# Altium footprint library 6-Connectors-4.PcbLib: 166 footprints (part 5 of 12)
Each footprint in its own frame and in the unit in brackets; x right, y up, seen from the top. Pads: shape width x height; smd on the part's side, far side on the other; paste and mask are expansions set on the pad; w line width, h text height; cw(c..) or ccw(c..) is an arc to the next point about the centre after c.
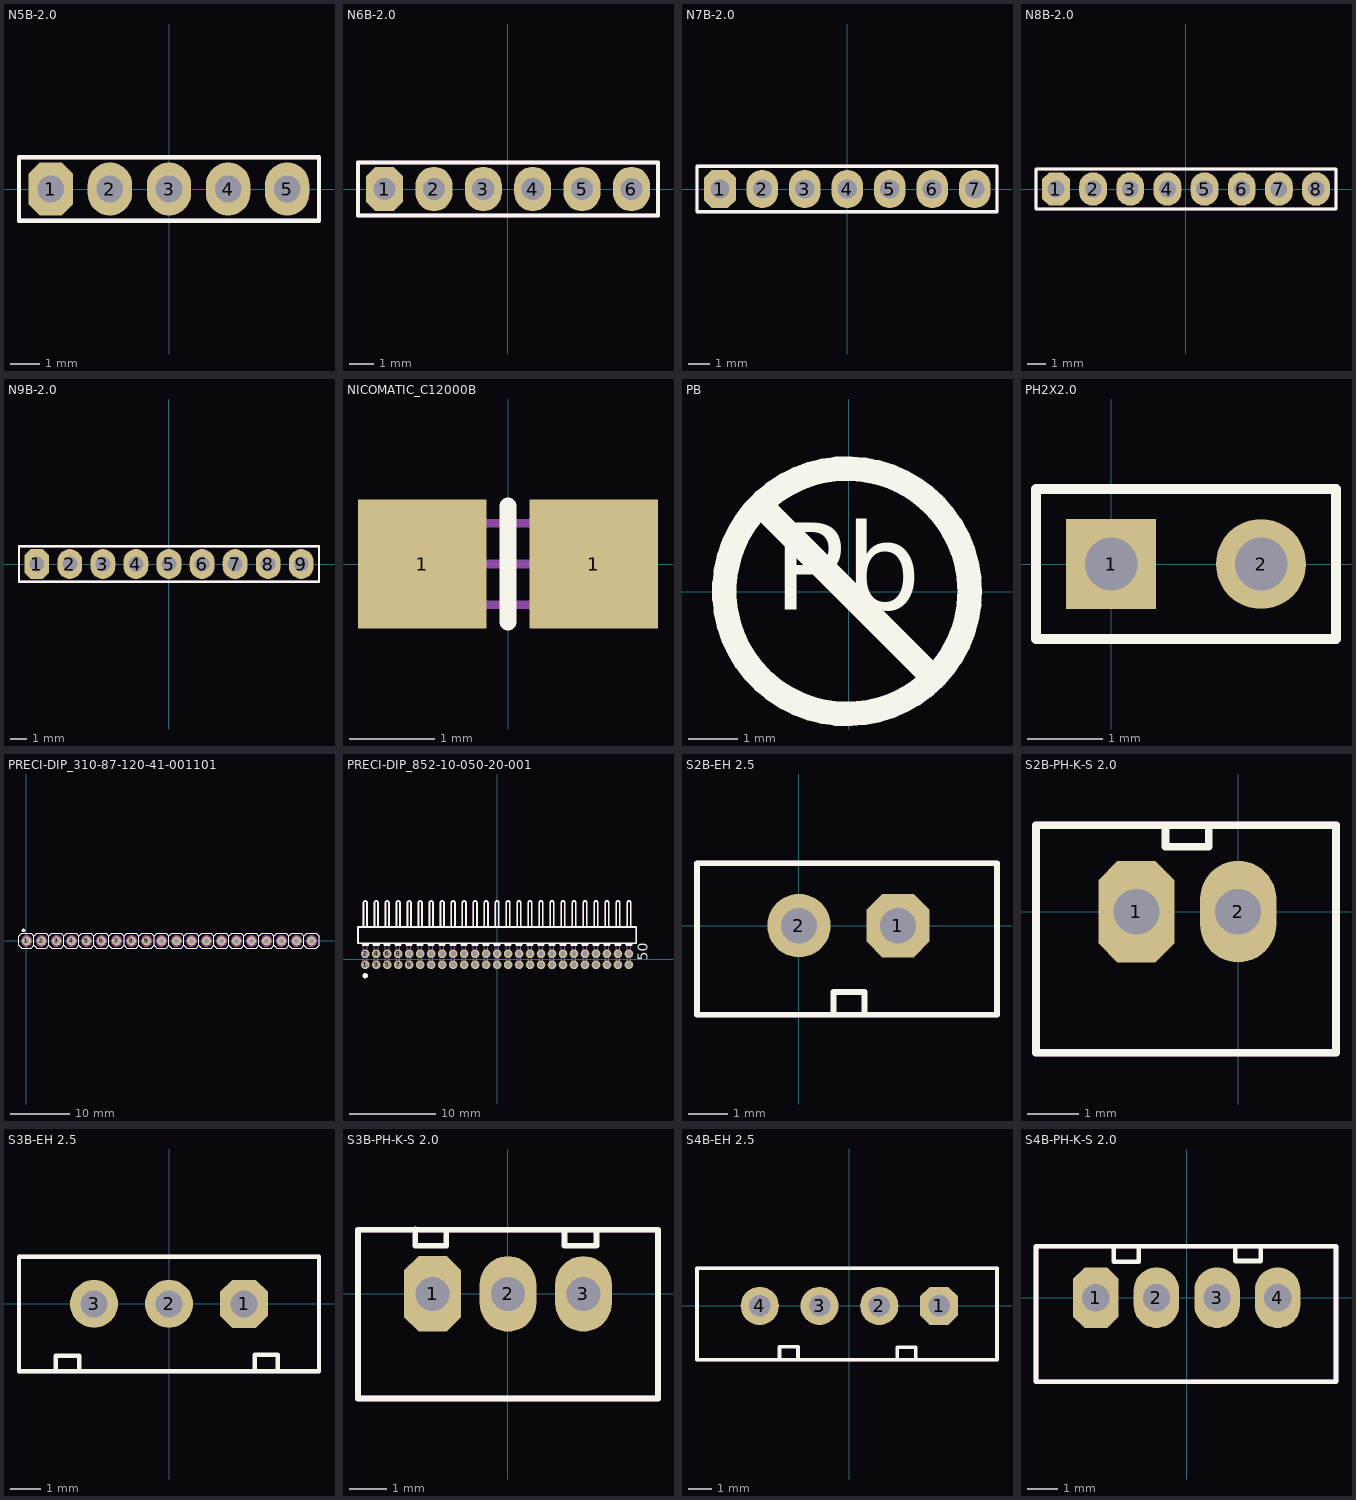
[diagram p4: the footprints below, top view; thin cyan lines are the x and y axes]

## N5B-2.0 [mm]
height 8.4
pads (5):
  oct 1.5x1.8 hole 0.9: 1(-4,0)
  oval 1.5x1.8 hole 0.9: 2(-2,0) 3(0,0) 4(2,0) 5(4,0)
Top Overlay:
  lines w0.15: -5.075,-1.075 -5.075,1.075 5.075,1.075 5.075,-1.075 -5.075,-1.075
Mechanical 10:
  lines w0.15: -5.075,-1.075 -5.075,1.075 5.075,1.075 5.075,-1.075 -5.075,-1.075
Mechanical 15:
  lines w0.15: -5.075,-1.075 -5.075,1.075 5.075,1.075 5.075,-1.075 -5.075,-1.075
3D body "1x2x05.stp": height 5.6, standoff -2.8, extent -5,-1 5,1

## N6B-2.0 [mm]
height 8.4
pads (6):
  oct 1.5x1.8 hole 0.9: 1(-5,0)
  oval 1.5x1.8 hole 0.9: 2(-3,0) 3(-1,0) 4(1,0) 5(3,0) 6(5,0)
Top Overlay:
  lines w0.15: -6.075,-1.075 -6.075,1.075 6.075,1.075 6.075,-1.075 -6.075,-1.075
Mechanical 10:
  lines w0.15: -6.075,-1.075 -6.075,1.075 6.075,1.075 6.075,-1.075 -6.075,-1.075
Mechanical 15:
  lines w0.15: -6.075,-1.075 -6.075,1.075 6.075,1.075 6.075,-1.075 -6.075,-1.075
3D body "1x2x06.stp": height 5.6, standoff -2.8, extent -6,-1 6,1

## N7B-2.0 [mm]
height 8.4
pads (7):
  oct 1.5x1.8 hole 0.9: 1(-6,0)
  oval 1.5x1.8 hole 0.9: 2(-4,0) 3(-2,0) 4(0,0) 5(2,0) 6(4,0) 7(6,0)
Top Overlay:
  lines w0.15: -7.075,-1.075 -7.075,1.075 7.05,1.075 7.05,-1.075 -7.075,-1.075
Mechanical 10:
  lines w0.15: -7.075,-1.075 -7.075,1.075 7.05,1.075 7.05,-1.075 -7.075,-1.075
Mechanical 15:
  lines w0.15: -7.075,-1.075 -7.075,1.075 7.05,1.075 7.05,-1.075 -7.075,-1.075
3D body "1x2x07.stp": height 5.6, standoff -2.8, extent -7.025,-1 6.975,1

## N8B-2.0 [mm]
height 8.4
pads (8):
  oct 1.5x1.8 hole 0.9: 1(-7,0)
  oval 1.5x1.8 hole 0.9: 2(-5,0) 3(-3,0) 4(-1,0) 5(1,0) 6(3,0) 7(5,0) 8(7,0)
Top Overlay:
  lines w0.15: -8.075,-1.075 -8.075,1.075 8.075,1.075 8.075,-1.075 -8.075,-1.075
Mechanical 10:
  lines w0.15: -8.075,-1.075 -8.075,1.075 8.075,1.075 8.075,-1.075 -8.075,-1.075
Mechanical 15:
  lines w0.15: -8.075,-1.075 -8.075,1.075 8.075,1.075 8.075,-1.075 -8.075,-1.075
3D body "1x2x08.stp": height 5.6, standoff -2.8, extent -8,-1 8,1

## N9B-2.0 [mm]
height 8.4
pads (9):
  oct 1.5x1.8 hole 0.9: 1(-8,0)
  oval 1.5x1.8 hole 0.9: 2(-6,0) 3(-4,0) 4(-2,0) 5(0,0) 6(2,0) 7(4,0) 8(6,0) 9(8,0)
Top Overlay:
  lines w0.15: -9.075,-1.075 -9.075,1.075 9.075,1.075 9.075,-1.075 -9.075,-1.075
Mechanical 10:
  lines w0.15: -9.075,-1.075 -9.075,1.075 9.075,1.075 9.075,-1.075 -9.075,-1.075
Mechanical 15:
  lines w0.15: -9.075,-1.075 -9.075,1.075 9.075,1.075 9.075,-1.075 -9.075,-1.075
3D body "1x2x09.stp": height 5.6, standoff -2.8, extent -9.025,-1 8.975,1

## NICOMATIC_C12000B [mm] "Surface Mount PCB Test Point"
height 1.5
pads (2):
  rect 1.5x1.5 smd: 1(-1,0) 1(1,0)
Top Overlay:
  lines w0.2: 0,-0.675 0,0.675
Mechanical 8:
  lines w0.1: -0.6,0 0,0 ; 0,-0.6 0,0 ; 0,0.6 0,0 ; 0.6,0 0,0
Mechanical 14:
  lines w0.1: -1.25,-0.675 -1.25,0.675 -0.35,0.675 -0.35,0.475 0.35,0.475 0.35,0.675 1.25,0.675 1.25,-0.675 0.35,-0.675 0.35,-0.475 -0.35,-0.475 -0.35,-0.675 -1.25,-0.675
3D body "p150-150.stp": height 0.02, standoff 0, extent 0.266,-0.75 1.766,0.75
3D body "p150-150.stp": height 0.02, standoff 0, extent -1.766,-0.75 -0.266,0.75
3D body "NICOMATIC_C12000B.stp": height 1.5, standoff 0, extent -1.25,-0.675 1.25,0.675

## PB [mm]
Top Overlay:
  circle w0.5: c-0.031,0.013 r2.5
  lines w0.5: -1.737,1.719 1.675,-1.693
  text "Pb" at -1.536,-0.948 h3.05
3D body "pb.stp": height 0.02, standoff 0, extent -2.725,-2.725 2.725,2.725

## PH2X2.0 [mm]
height 8.4
pads (2):
  rect 1.2x1.2 hole 0.7: 1(0,0)
  round 1.2 hole 0.7: 2(2,0)
Top Overlay:
  lines w0.127: -1,-1 -1,1 3,1 3,-1 -1,-1

## PRECI-DIP_310-87-120-41-001101 [mm] "20 Contact 2.54mm Pitch Single Row Socket Connector - Mating Pin  ?.47mm"
height 4.2
pads (20):
  round 1.5 hole 0.8: 1(0,0) 2(2.54,0) 3(5.08,0) 4(7.62,0) 5(10.16,0) 6(12.7,0) 7(15.24,0) 8(17.78,0) 9(20.32,0) 10(22.86,0) 11(25.4,0) 12(27.94,0) 13(30.48,0) 14(33.02,0) 15(35.56,0) 16(38.1,0) 17(40.64,0) 18(43.18,0) 19(45.72,0) 20(48.26,0)
Top Overlay:
  circle w0.3: c-0.508,1.778 r0.15
  lines w0.2: 1.27,-0.77 1.27,0.77 ; 1.27,-0.77 0.77,-1.27 -0.77,-1.27 -1.27,-0.77 -1.27,0.77 -0.77,1.27 0.77,1.27 1.27,0.77 ; 1.27,-0.77 1.77,-1.27 3.31,-1.27 3.81,-0.77 ; 1.27,0.77 1.77,1.27 3.31,1.27 3.81,0.77 ; 3.81,-0.77 3.81,0.77 ; 3.81,-0.77 4.31,-1.27 5.85,-1.27 6.35,-0.77 ; 3.81,0.77 4.31,1.27 5.85,1.27 6.35,0.77 ; 6.35,-0.77 6.35,0.77 ; 6.35,-0.77 6.85,-1.27 8.39,-1.27 8.89,-0.77 ; 6.35,0.77 6.85,1.27 8.39,1.27 8.89,0.77 ; 8.89,-0.77 8.89,0.77 ; 8.89,-0.77 9.39,-1.27 10.93,-1.27 11.43,-0.77 ; 8.89,0.77 9.39,1.27 10.93,1.27 11.43,0.77 ; 11.43,-0.77 11.43,0.77 ; 11.43,-0.77 11.93,-1.27 13.47,-1.27 13.97,-0.77 ; 11.43,0.77 11.93,1.27 13.47,1.27 13.97,0.77 ; 13.97,-0.77 13.97,0.77 ; 13.97,-0.77 14.47,-1.27 16.01,-1.27 16.51,-0.77 ; 13.97,0.77 14.47,1.27 16.01,1.27 16.51,0.77 ; 16.51,-0.77 16.51,0.77 ; 16.51,-0.77 17.01,-1.27 18.55,-1.27 19.05,-0.77 ; 16.51,0.77 17.01,1.27 18.55,1.27 19.05,0.77 ; 19.05,-0.77 19.05,0.77 ; 19.05,-0.77 19.55,-1.27 21.09,-1.27 21.59,-0.77 ; 19.05,0.77 19.55,1.27 21.09,1.27 21.59,0.77 ; 21.59,-0.77 21.59,0.77 ; 21.59,-0.77 22.09,-1.27 23.63,-1.27 24.13,-0.77 ; 21.59,0.77 22.09,1.27 23.63,1.27 24.13,0.77 ; 24.13,-0.77 24.13,0.77 ; 24.13,-0.77 24.63,-1.27 26.17,-1.27 26.67,-0.77 ; 24.13,0.77 24.63,1.27 26.17,1.27 26.67,0.77 ; 26.67,-0.77 26.67,0.77 ; 26.67,-0.77 27.17,-1.27 28.71,-1.27 29.21,-0.77 ; 26.67,0.77 27.17,1.27 28.71,1.27 29.21,0.77 ; 29.21,-0.77 29.21,0.77 ; 29.21,-0.77 29.71,-1.27 31.25,-1.27 31.75,-0.77 ; 29.21,0.77 29.71,1.27 31.25,1.27 31.75,0.77 ; 31.75,-0.77 31.75,0.77 ; 31.75,-0.77 32.25,-1.27 33.79,-1.27 34.29,-0.77 ; 31.75,0.77 32.25,1.27 33.79,1.27 34.29,0.77 ; 34.29,-0.77 34.29,0.77 ; 34.29,-0.77 34.79,-1.27 36.33,-1.27 36.83,-0.77 ; 34.29,0.77 34.79,1.27 36.33,1.27 36.83,0.77 ; 36.83,-0.77 36.83,0.77 ; 36.83,-0.77 37.33,-1.27 38.87,-1.27 39.37,-0.77 ; 36.83,0.77 37.33,1.27 38.87,1.27 39.37,0.77 ; 39.37,-0.77 39.37,0.77 ; 39.37,-0.77 39.87,-1.27 41.41,-1.27 41.91,-0.77 ; 39.37,0.77 39.87,1.27 41.41,1.27 41.91,0.77 ; 41.91,-0.77 41.91,0.77 ; 41.91,-0.77 42.41,-1.27 43.95,-1.27 44.45,-0.77 ; 41.91,0.77 42.41,1.27 43.95,1.27 44.45,0.77 ; 44.45,-0.77 44.45,0.77 ; 44.45,-0.77 44.95,-1.27 46.49,-1.27 46.99,-0.77 ; 44.45,0.77 44.95,1.27 46.49,1.27 46.99,0.77 ; 46.99,-0.77 46.99,0.77 ; 46.99,-0.77 47.49,-1.27 49.03,-1.27 49.53,-0.77 49.53,0.77 49.03,1.27 47.49,1.27 46.99,0.77
Mechanical 8:
  lines w0.1: -0.5,0 0,0 ; 0,-0.5 0,0 ; 0,0.5 0,0 ; 0.5,0 0,0 ; 2.04,0 2.54,0 ; 2.54,-0.5 2.54,0 ; 2.54,0.5 2.54,0 ; 3.04,0 2.54,0 ; 4.58,0 5.08,0 ; 5.08,-0.5 5.08,0 ; 5.08,0.5 5.08,0 ; 5.58,0 5.08,0 ; 7.12,0 7.62,0 ; 7.62,-0.5 7.62,0 ; 7.62,0.5 7.62,0 ; 8.12,0 7.62,0 ; 9.66,0 10.16,0 ; 10.16,-0.5 10.16,0 ; 10.16,0.5 10.16,0 ; 10.66,0 10.16,0 ; 12.2,0 12.7,0 ; 12.7,-0.5 12.7,0 ; 12.7,0.5 12.7,0 ; 13.2,0 12.7,0 ; 14.74,0 15.24,0 ; 15.24,-0.5 15.24,0 ; 15.24,0.5 15.24,0 ; 15.74,0 15.24,0 ; 17.28,0 17.78,0 ; 17.78,-0.5 17.78,0 ; 17.78,0.5 17.78,0 ; 18.28,0 17.78,0 ; 19.82,0 20.32,0 ; 20.32,-0.5 20.32,0 ; 20.32,0.5 20.32,0 ; 20.82,0 20.32,0 ; 22.36,0 22.86,0 ; 22.86,-0.5 22.86,0 ; 22.86,0.5 22.86,0 ; 23.36,0 22.86,0 ; 24.9,0 25.4,0 ; 25.4,-0.5 25.4,0 ; 25.4,0.5 25.4,0 ; 25.9,0 25.4,0 ; 27.44,0 27.94,0 ; 27.94,-0.5 27.94,0 ; 27.94,0.5 27.94,0 ; 28.44,0 27.94,0 ; 29.98,0 30.48,0 ; 30.48,-0.5 30.48,0 ; 30.48,0.5 30.48,0 ; 30.98,0 30.48,0 ; 32.52,0 33.02,0 ; 33.02,-0.5 33.02,0 ; 33.02,0.5 33.02,0 ; 33.52,0 33.02,0 ; 35.06,0 35.56,0 ; 35.56,-0.5 35.56,0 ; 35.56,0.5 35.56,0 ; 36.06,0 35.56,0 ; 37.6,0 38.1,0 ; 38.1,-0.5 38.1,0 ; 38.1,0.5 38.1,0 ; 38.6,0 38.1,0 ; 40.14,0 40.64,0 ; 40.64,-0.5 40.64,0 ; 40.64,0.5 40.64,0 ; 41.14,0 40.64,0 ; 42.68,0 43.18,0 ; 43.18,-0.5 43.18,0 ; 43.18,0.5 43.18,0 ; 43.68,0 43.18,0 ; 45.22,0 45.72,0 ; 45.72,-0.5 45.72,0 ; 45.72,0.5 45.72,0 ; 46.22,0 45.72,0 ; 47.76,0 48.26,0 ; 48.26,-0.5 48.26,0 ; 48.26,0.5 48.26,0 ; 48.76,0 48.26,0
Mechanical 14:
  drawing of 222 lines, arcs and shapes, not listed
3D body "PRECI-DIP_310-87-120-41-001101.stp": height 4.2, standoff -3.17, extent -1.27,-1.27 49.53,1.27

## PRECI-DIP_852-10-050-20-001 [mm] "50 Contacts, Ultraminiature PCB Pin Connector 1.27mm, Double Row, Solder Tail, Right Angle"
height 3.25
pads (50):
  round 1 hole 0.6: 1(-15.24,-0.635) 2(-15.24,0.635) 3(-13.97,-0.635) 4(-13.97,0.635) 5(-12.7,-0.635) 6(-12.7,0.635) 7(-11.43,-0.635) 8(-11.43,0.635) 9(-10.16,-0.635) 10(-10.16,0.635) 11(-8.89,-0.635) 12(-8.89,0.635) 13(-7.62,-0.635) 14(-7.62,0.635) 15(-6.35,-0.635) 16(-6.35,0.635) 17(-5.08,-0.635) 18(-5.08,0.635) 19(-3.81,-0.635) 20(-3.81,0.635) 21(-2.54,-0.635) 22(-2.54,0.635) 23(-1.27,-0.635) 24(-1.27,0.635) 25(0,-0.635) 26(0,0.635) 27(1.27,-0.635) 28(1.27,0.635) 29(2.54,-0.635) 30(2.54,0.635) 31(3.81,-0.635) 32(3.81,0.635) 33(5.08,-0.635) 34(5.08,0.635) 35(6.35,-0.635) 36(6.35,0.635) 37(7.62,-0.635) 38(7.62,0.635) 39(8.89,-0.635) 40(8.89,0.635) 41(10.16,-0.635) 42(10.16,0.635) 43(11.43,-0.635) 44(11.43,0.635) 45(12.7,-0.635) 46(12.7,0.635) 47(13.97,-0.635) 48(13.97,0.635) 49(15.24,-0.635) 50(15.24,0.635)
Top Overlay:
  drawing of 155 lines, arcs and shapes, not listed
  text "50" at 17.4,-0.2 h1.2
Mechanical 8:
  lines w0.1: 0,1 0,0 1,0
Mechanical 14:
  drawing of 229 lines, arcs and shapes, not listed
3D body "PRECI-DIP_852-10-050-20-001.stp": height 3.25, standoff -3.2, extent -16.08,-0.84 16.08,6.725
3D body "v105-065.stp": height 0.02, standoff -1.65, extent -15.765,-1.16 -14.715,-0.11
3D body "v105-065.stp": height 0.02, standoff -1.65, extent -15.765,0.11 -14.715,1.16
3D body "v105-065.stp": height 0.02, standoff -1.65, extent -14.495,-1.16 -13.445,-0.11
3D body "v105-065.stp": height 0.02, standoff -1.65, extent -14.495,0.11 -13.445,1.16
3D body "v105-065.stp": height 0.02, standoff -1.65, extent -13.225,0.11 -12.175,1.16
3D body "v105-065.stp": height 0.02, standoff -1.65, extent -13.225,-1.16 -12.175,-0.11
3D body "v105-065.stp": height 0.02, standoff -1.65, extent -11.955,-1.16 -10.905,-0.11
3D body "v105-065.stp": height 0.02, standoff -1.65, extent -11.955,0.11 -10.905,1.16
3D body "v105-065.stp": height 0.02, standoff -1.65, extent -6.875,0.11 -5.825,1.16
3D body "v105-065.stp": height 0.02, standoff -1.65, extent -8.145,0.11 -7.095,1.16
3D body "v105-065.stp": height 0.02, standoff -1.65, extent -9.415,0.11 -8.365,1.16
3D body "v105-065.stp": height 0.02, standoff -1.65, extent -10.685,0.11 -9.635,1.16
3D body "v105-065.stp": height 0.02, standoff -1.65, extent -6.875,-1.16 -5.825,-0.11
3D body "v105-065.stp": height 0.02, standoff -1.65, extent -8.145,-1.16 -7.095,-0.11
3D body "v105-065.stp": height 0.02, standoff -1.65, extent -9.415,-1.16 -8.365,-0.11
3D body "v105-065.stp": height 0.02, standoff -1.65, extent -10.685,-1.16 -9.635,-0.11
3D body "v105-065.stp": height 0.02, standoff -1.65, extent -1.795,0.11 -0.745,1.16
3D body "v105-065.stp": height 0.02, standoff -1.65, extent -3.065,0.11 -2.015,1.16
3D body "v105-065.stp": height 0.02, standoff -1.65, extent -4.335,0.11 -3.285,1.16
3D body "v105-065.stp": height 0.02, standoff -1.65, extent -5.605,0.11 -4.555,1.16
3D body "v105-065.stp": height 0.02, standoff -1.65, extent -1.795,-1.16 -0.745,-0.11
3D body "v105-065.stp": height 0.02, standoff -1.65, extent -3.065,-1.16 -2.015,-0.11
3D body "v105-065.stp": height 0.02, standoff -1.65, extent -4.335,-1.16 -3.285,-0.11
3D body "v105-065.stp": height 0.02, standoff -1.65, extent -5.605,-1.16 -4.555,-0.11
3D body "v105-065.stp": height 0.02, standoff -1.65, extent 3.285,0.11 4.335,1.16
3D body "v105-065.stp": height 0.02, standoff -1.65, extent 2.015,0.11 3.065,1.16
3D body "v105-065.stp": height 0.02, standoff -1.65, extent 0.745,0.11 1.795,1.16
3D body "v105-065.stp": height 0.02, standoff -1.65, extent -0.525,0.11 0.525,1.16
3D body "v105-065.stp": height 0.02, standoff -1.65, extent 3.285,-1.16 4.335,-0.11
3D body "v105-065.stp": height 0.02, standoff -1.65, extent 2.015,-1.16 3.065,-0.11
3D body "v105-065.stp": height 0.02, standoff -1.65, extent 0.745,-1.16 1.795,-0.11
3D body "v105-065.stp": height 0.02, standoff -1.65, extent -0.525,-1.16 0.525,-0.11
3D body "v105-065.stp": height 0.02, standoff -1.65, extent 8.365,0.11 9.415,1.16
3D body "v105-065.stp": height 0.02, standoff -1.65, extent 7.095,0.11 8.145,1.16
3D body "v105-065.stp": height 0.02, standoff -1.65, extent 5.825,0.11 6.875,1.16
3D body "v105-065.stp": height 0.02, standoff -1.65, extent 4.555,0.11 5.605,1.16
3D body "v105-065.stp": height 0.02, standoff -1.65, extent 8.365,-1.16 9.415,-0.11
3D body "v105-065.stp": height 0.02, standoff -1.65, extent 7.095,-1.16 8.145,-0.11
3D body "v105-065.stp": height 0.02, standoff -1.65, extent 5.825,-1.16 6.875,-0.11
3D body "v105-065.stp": height 0.02, standoff -1.65, extent 4.555,-1.16 5.605,-0.11
3D body "v105-065.stp": height 0.02, standoff -1.65, extent 13.445,0.11 14.495,1.16
3D body "v105-065.stp": height 0.02, standoff -1.65, extent 12.175,0.11 13.225,1.16
3D body "v105-065.stp": height 0.02, standoff -1.65, extent 10.905,0.11 11.955,1.16
3D body "v105-065.stp": height 0.02, standoff -1.65, extent 9.635,0.11 10.685,1.16
3D body "v105-065.stp": height 0.02, standoff -1.65, extent 13.445,-1.16 14.495,-0.11
3D body "v105-065.stp": height 0.02, standoff -1.65, extent 12.175,-1.16 13.225,-0.11
3D body "v105-065.stp": height 0.02, standoff -1.65, extent 10.905,-1.16 11.955,-0.11
3D body "v105-065.stp": height 0.02, standoff -1.65, extent 9.635,-1.16 10.685,-0.11
3D body "v105-065.stp": height 0.02, standoff -1.65, extent 14.715,-1.16 15.765,-0.11
3D body "v105-065.stp": height 0.02, standoff -1.65, extent 14.715,0.11 15.765,1.16

## S2B-EH 2.5 [mm]
height 3.25
pads (2):
  oct 1.6x1.6 hole 0.9: 1(2.5,0)
  round 1.6 hole 0.9 mask+0.07: 2(0,0)
Top Overlay:
  lines w0.15: 0.875,-2.175 0.875,-1.675 1.65,-1.675 1.65,-2.2 ; -2.575,-2.25 -2.575,1.575 5,1.575 5,-2.25 -2.575,-2.25
Mechanical 14:
  lines w0.15: -2.575,-2.25 -2.575,1.575 5,1.575 5,-2.25 -2.575,-2.25
Mechanical 15:
  lines w0.15: -2.575,-2.25 -2.575,1.575 5,1.575 5,-2.25 -2.575,-2.25
3D body "s2b-eh.stp": height 6, standoff -3.2, extent -2.575,-2.175 4.925,1.625

## S2B-PH-K-S 2.0 [mm]
height 3.25
pads (2):
  oct 1.5x2 hole 0.9: 1(-2,0)
  oval 1.5x2 hole 0.9: 2(0,0)
Top Overlay:
  lines w0.152: -1.43,1.675 -1.43,1.275 -0.58,1.275 -0.58,1.665 ; -3.975,-2.775 -3.975,1.7 1.925,1.7 1.925,-2.775 -3.975,-2.775
Mechanical 11:
  lines w0.152: -3.975,-2.775 -3.975,1.7 1.925,1.7 1.925,-2.775 -3.975,-2.775
Mechanical 14:
  lines w0.152: -3.975,-2.775 -3.975,1.7 1.925,1.7 1.925,-2.775 -3.975,-2.775
3D body "s2b-ph-k-s.stp": height 6, standoff -3.3, extent -3.975,-2.8 1.925,1.7

## S3B-EH 2.5 [mm]
height 3.25
pads (3):
  oct 1.6x1.6 hole 0.9: 1(2.5,0)
  round 1.6 hole 0.9 mask+0.07: 2(0,0) 3(-2.5,0)
Top Overlay:
  lines w0.15: -3.775,-2.225 -3.775,-1.725 -3,-1.725 -3,-2.25 ; 2.85,-2.2 2.85,-1.7 3.625,-1.7 3.625,-2.225 ; -5,-2.25 -5,1.575 5,1.575 5,-2.25 -5,-2.25
Mechanical 14:
  lines w0.15: -5,-2.25 -5,1.575 5,1.575 5,-2.25 -5,-2.25
Mechanical 15:
  lines w0.15: -5,-2.25 -5,1.575 5,1.575 5,-2.25 -5,-2.25
3D body "s3b-eh.stp": height 6, standoff -3.2, extent -5,-2.225 5,1.575

## S3B-PH-K-S 2.0 [mm]
height 3.25
pads (3):
  oct 1.5x2 hole 0.9: 1(-2,0)
  oval 1.5x2 hole 0.9: 2(0,0) 3(2,0)
Top Overlay:
  lines w0.152: -2.455,1.705 -2.455,1.275 -1.635,1.275 -1.635,1.695 ; 1.495,1.675 1.495,1.275 2.345,1.275 2.345,1.665 ; -3.975,-2.775 3.975,-2.775 3.975,1.7 -3.975,1.7 -3.975,-2.775
Mechanical 11:
  lines w0.152: -3.975,-2.775 3.975,-2.775 3.975,1.7 -3.975,1.7 -3.975,-2.775
Mechanical 14:
  lines w0.152: -3.975,-2.775 3.975,-2.775 3.975,1.7 -3.975,1.7 -3.975,-2.775
3D body "s3b-ph-k-s.stp": height 6, standoff -3.4, extent -3.95,-2.8 3.95,1.7

## S4B-EH 2.5 [mm]
height 3.25
pads (4):
  oct 1.6x1.6 hole 0.9: 1(3.75,0)
  round 1.6 hole 0.9 mask+0.07: 2(1.25,0) 3(-1.25,0) 4(-3.75,0)
Top Overlay:
  lines w0.15: -2.925,-2.2 -2.925,-1.7 -2.15,-1.7 -2.15,-2.225 ; 2,-2.225 2,-1.725 2.775,-1.725 2.775,-2.25 ; -6.375,-2.25 6.175,-2.25 6.175,1.575 -6.375,1.575 -6.375,-2.25
Mechanical 14:
  lines w0.15: -6.375,-2.25 6.175,-2.25 6.175,1.575 -6.375,1.575 -6.375,-2.25
Mechanical 15:
  lines w0.15: -6.375,-2.25 6.175,-2.25 6.175,1.575 -6.375,1.575 -6.375,-2.25
3D body "s4b-eh.stp": height 6, standoff -3.2, extent -6.375,-2.225 6.125,1.575

## S4B-PH-K-S 2.0 [mm]
height 3.25
pads (4):
  oct 1.5x2 hole 0.9: 1(-3,0)
  oval 1.5x2 hole 0.9: 2(-1,0) 3(1,0) 4(3,0)
Top Overlay:
  lines w0.152: -2.405,1.68 -2.405,1.19 -1.585,1.19 -1.585,1.67 ; 1.595,1.7 1.595,1.21 2.445,1.21 2.445,1.69 ; -4.975,-2.775 4.925,-2.775 4.925,1.7 -4.975,1.7 -4.975,-2.775
Mechanical 11:
  lines w0.152: -4.975,-2.775 4.925,-2.775 4.925,1.7 -4.975,1.7 -4.975,-2.775
Mechanical 14:
  lines w0.152: -4.975,-2.775 4.925,-2.775 4.925,1.7 -4.975,1.7 -4.975,-2.775
3D body "s4b-ph-k-s.stp": height 6, standoff -3.3, extent -5,-2.8 4.9,1.7